# Altium footprint library Test.PcbLib: 245 footprints (part 15 of 17)
Each footprint in its own frame and in the unit in brackets; x right, y up, seen from the top. Pads: shape width x height; smd on the part's side, far side on the other; paste and mask are expansions set on the pad; w line width, h text height; cw(c..) or ccw(c..) is an arc to the next point about the centre after c.
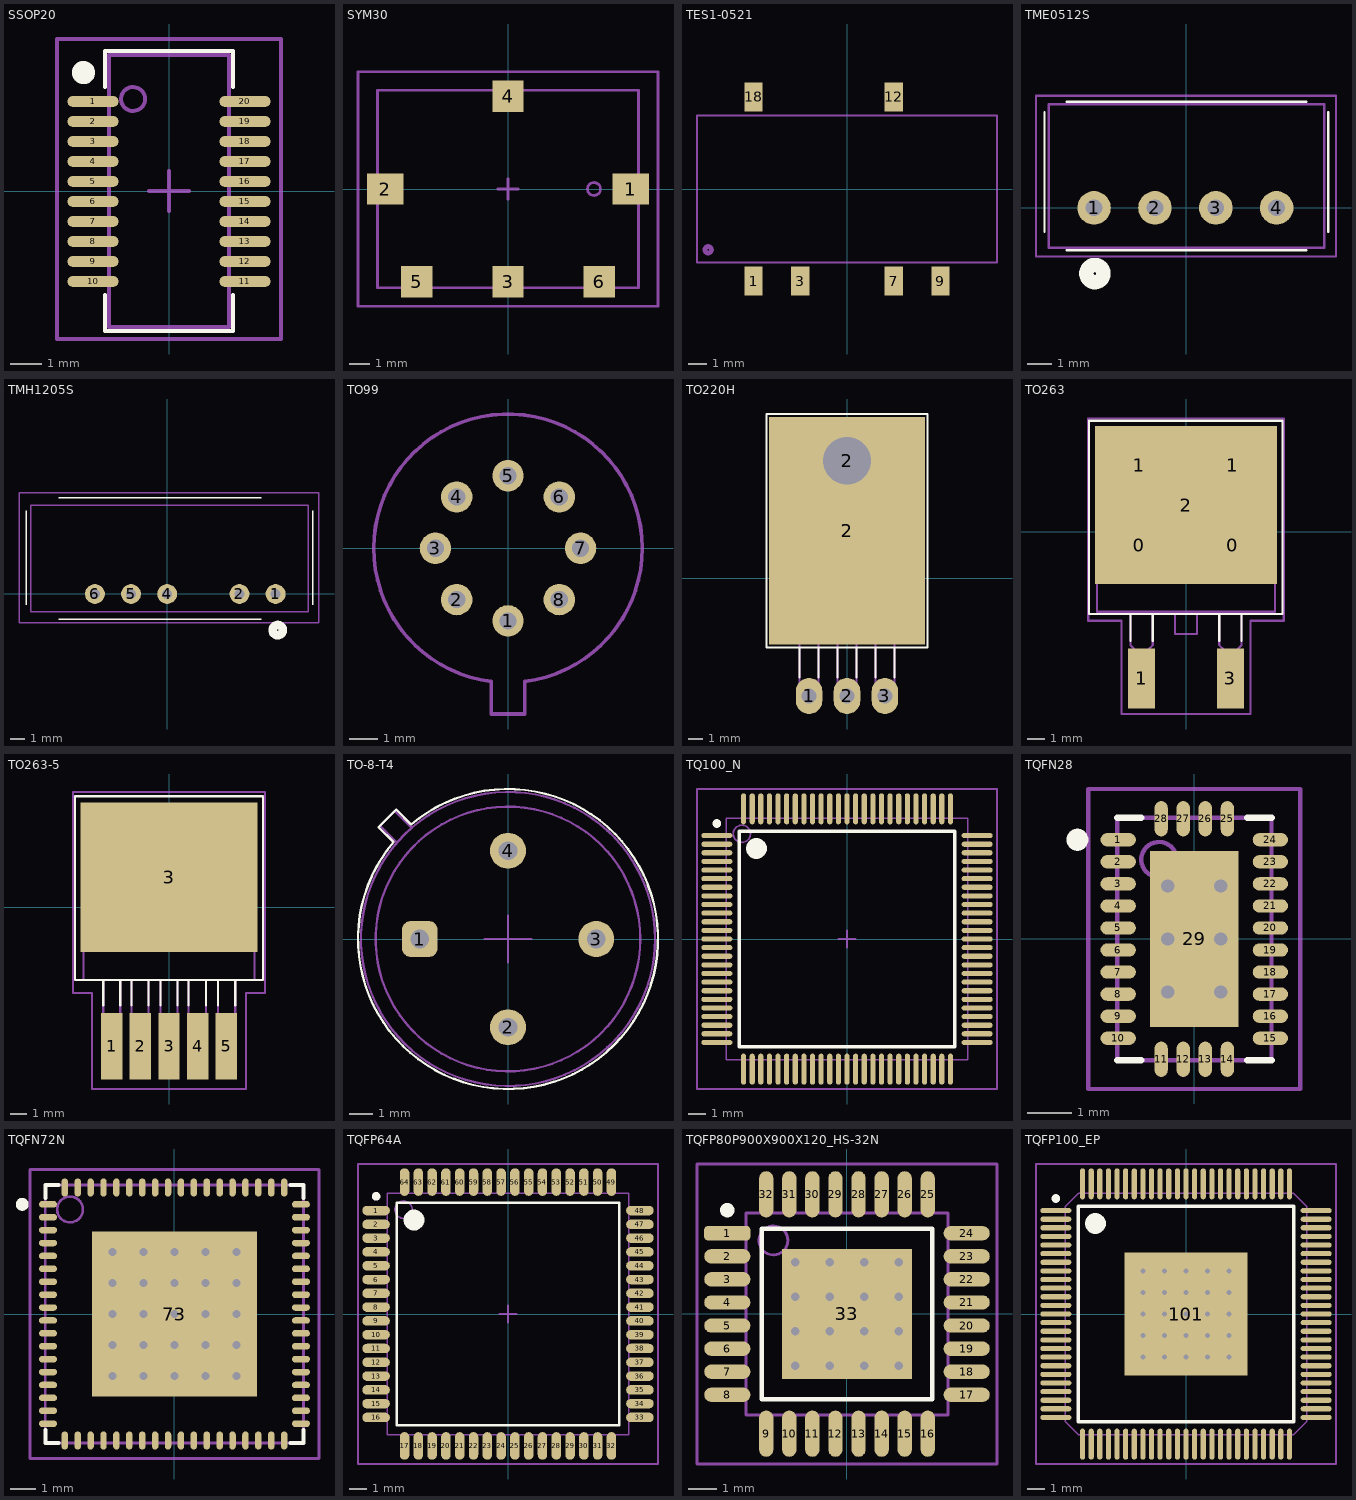
[diagram p14: the footprints below, top view; thin cyan lines are the x and y axes]

## SSOP20 [mil] "SSOP20 R0.635mm 8.6x3.8mm"
height 62.99
pads (20):
  oval 64x13.78 smd mask+2: 1(-95,112) 2(-95,87) 3(-95,62) 4(-95,37) 5(-95,12) 6(-95,-13) 7(-95,-38) 8(-95,-63) 9(-95,-88) 10(-95,-113) 11(95,-113) 12(95,-88) 13(95,-63) 14(95,-38) 15(95,-13) 16(95,12) 17(95,37) 18(95,62) 19(95,87) 20(95,112)
Top Overlay:
  circle w15: c-107,148 r7
  lines w5: -80,-130 -80,-175 80,-175 80,-130 ; -80,130 -80,175 80,175 80,130
Mechanical 13:
  circle w5: c-45,115 r15
  lines w5: -75,-170 -75,170 75,170 75,-170 -75,-170
Mechanical 15:
  lines w5: -25,0 25,0 ; 0,-25 0,25 ; -140,-185 -140,190 140,190 140,-185 -140,-185
3D body: height 62.99, standoff 5.91, extent -75,-170 75,170
3D body: height 63.39, standoff 62.99, extent -60.29,99.71 -29.71,130.29

## SYM30 [mil]
pads (6):
  rect 70x60 smd: 1(235,0) 2(-235,0)
  rect 60x60 smd: 3(0,-178) 4(0,178) 5(-175,-178) 6(175,-178)
Mechanical 13:
  circle w5: c164.72,0 r12.45
  lines w5: -250,-188.98 250,-188.98 250,188.98 -250,188.98 -250,-188.98
Mechanical 15:
  lines w5: -20,0 20,0 ; 0,-20 0,20 ; -287.4,-224.41 287.4,-224.41 287.4,224.41 -287.4,224.41 -287.4,-224.41
3D body: height 231, standoff 230, extent 151.75,-13.25 177.4,13.24
3D body: height 230, standoff 0, extent -250,-188.98 250,188.98

## TES1-0521 [mm] "TES10521 6 pin, Body 16.3x8x7mm (LxWxH), Pitch 2,54mm"
height 7
pads (6):
  rect 1x1.6 smd: 1(-5.08,-5) 3(-2.54,-5) 7(2.54,-5) 9(5.08,-5) 12(2.54,5) 18(-5.08,5)
Mechanical 13:
  circle w0.254: c-7.546,-3.302 r0.18
  lines w0.102: -8.15,-4 -8.15,4 8.15,4 8.15,-4 -8.15,-4
3D body: height 1.5, standoff 0, extent -5.334,-5.461 -4.826,-4
3D body: height 1.5, standoff 0, extent -2.794,-5.461 -2.286,-4
3D body: height 1.5, standoff 0, extent 2.286,-5.461 2.794,-4
3D body: height 1.5, standoff 0, extent 4.826,-5.461 5.334,-4
3D body: height 1.5, standoff 0, extent 2.286,4 2.794,5.461
3D body: height 1.5, standoff 0, extent -5.334,4 -4.826,5.461
3D body: height 7.01, standoff 7, extent -5.588,-3.302 -4.592,-2.304
3D body: height 7, standoff 0, extent -8.15,-4 8.15,4

## TME0512S [mm] "TME0512S 4 pin, Body 11.5x6x10.2mm (LxWxH), Pitch 2,54mm"
height 10.2
pads (4):
  round 1.4 hole 0.7: 1(-3.85,0) 2(-1.31,0) 3(1.23,0) 4(3.77,0)
Top Overlay:
  circle w0.6: c-3.814,-2.743 r0.359
  lines w0.102: -5.918,-1 -5.918,4 ; -5,-1.778 5,-1.778 ; -5,4.428 5,4.428 ; 5.918,-1 5.918,4
Mechanical 13:
  lines w0.102: -5.75,-1.675 5.75,-1.675 5.75,4.325 -5.75,4.325 -5.75,-1.675
Mechanical 15:
  lines w0.102: -6.274,-2.032 -6.274,4.674 6.248,4.674 6.248,-2.032 -6.274,-2.032
3D body: height 10.2, standoff 0.5, extent -5.105,-1.675 5.105,4.325
3D body: height 0.5, standoff 0, extent -5.75,-1.675 -5.105,4.325
3D body: height 0.5, standoff 0, extent 5.08,-1.675 5.75,4.325
3D body: height 0.5, standoff -3.2, extent 0.925,-0.203 1.509,0.203
3D body: height 0.5, standoff -3.2, extent 3.465,-0.203 4.049,0.203
3D body: height 0.5, standoff -3.2, extent -1.615,-0.203 -1.031,0.203
3D body: height 0.5, standoff -3.2, extent -4.155,-0.203 -3.571,0.203

## TMH1205S [mm] "TMH1205S 5 pin, Body 19.5x7.5x10.2mm (LxWxH), Pitch 2,54mm"
height 10.2
pads (5):
  round 1.4 hole 0.7: 1(7.62,0) 2(5.08,0) 4(0,0) 5(-2.54,0) 6(-5.08,0)
Top Overlay:
  circle w0.6: c7.769,-2.54 r0.359
  lines w0.102: -9.906,-0.762 -9.906,5.842 ; -7.62,-1.778 6.604,-1.778 ; -7.62,6.778 6.604,6.778 ; 10.246,-0.762 10.246,5.842
Mechanical 13:
  lines w0.102: -9.58,-1.25 9.92,-1.25 9.92,6.25 -9.58,6.25 -9.58,-1.25
Mechanical 15:
  lines w0.102: -10.414,-2.032 -10.414,7.112 10.668,7.112 10.668,-2.032 -10.414,-2.032
3D body: height 10.2, standoff 0.5, extent -9.58,-1.25 9.92,6.25
3D body: height 0.5, standoff 0, extent -9.58,-1.25 -8.89,6.25
3D body: height 0.5, standoff 0, extent 9.23,-1.25 9.92,6.25
3D body: height 0.5, standoff -3.2, extent -5.359,-0.203 -4.775,0.203
3D body: height 0.5, standoff -3.2, extent -2.819,-0.203 -2.235,0.203
3D body: height 0.5, standoff -3.2, extent -0.279,-0.203 0.305,0.203
3D body: height 0.5, standoff -3.2, extent 4.801,-0.203 5.385,0.203
3D body: height 0.5, standoff -3.2, extent 7.341,-0.203 7.925,0.203

## TO99 [mm] "TO-99"
height 4.7
pads (8):
  round 1.1 hole 0.6: 1(0,-2.54) 2(-1.796,-1.796) 3(-2.54,0) 4(-1.796,1.796) 5(0,2.54) 6(1.796,1.796) 7(2.54,0) 8(1.796,-1.796)
Mechanical 13:
  lines w0.127: -0.583,-5.8 0.583,-5.8 0.583,-4.664 ccw(c0,0) -0.583,-4.664 -0.583,-5.8
3D body: height 0, standoff -6, extent -2.096,1.504 -1.499,2.103
3D body: height 0, standoff -6, extent 1.504,1.499 2.102,2.097
3D body: height 0, standoff -6, extent 1.499,-2.103 2.096,-1.504
3D body: height 0, standoff -6, extent -2.103,-2.096 -1.505,-1.497
3D body: height 0, standoff -6, extent -0.305,-2.845 0.293,-2.246
3D body: height 0, standoff -6, extent -0.294,2.247 0.304,2.846
3D body: height 0, standoff -6, extent 2.247,-0.305 2.845,0.294
3D body: height 0, standoff -6, extent -2.845,-0.305 -2.247,0.294
3D body: height 1, standoff 0, extent -0.583,-5.8 0.583,-4.664
3D body: height 4.71, standoff 4.7, extent -0.305,-4.064 0.293,-3.465
3D body: height 4.7, standoff 0, extent -4.689,-4.699 4.674,4.682

## TO220H [mil] "TO-220 horizontal"
height 196.85
pads (5):
  oval 70x95 hole 39.37: 1(-100,-310) 2(0,-310) 3(100,-310)
  rect 410x600 smd paste-500: 2(0,125)
  round 157.48 hole 125.98 mask+47.24: 2(0,310)
Top Overlay:
  lines w5: -125,-260.83 -125,-182.09 ; -74.8,-260.83 -74.8,-182.09 ; -25,-260.83 -25,-182.09 ; 25.2,-260.83 25.2,-182.09 ; 75,-260.83 75,-182.09 ; 125.2,-260.83 125.2,-182.09 ; -212.6,-182.09 -212.6,433.07 212.6,433.07 212.6,-182.09 -212.6,-182.09
Mechanical 13:
  circle w5: c0,310 r75
  lines w5: -200,155 200,155 ; -125,-170 -125,-310 -75,-310 -75,-170 ; -25,-170 -25,-310 25,-310 25,-170 ; 75,-170 75,-310 125,-310 125,-170 ; -200,170 200,170 ; -200,170 -200,-170 200,-170 200,170 ; -200,170 -200,420 200,420 200,170
3D body: height 102.36, standoff 90.55, extent 75,-320 125,-170
3D body: height 90.55, standoff 0, extent 75,-320 125,-305
3D body: height 102.36, standoff 90.55, extent -25,-320 25,-170
3D body: height 90.55, standoff 0, extent -25,-320 25,-305
3D body: height 90.55, standoff 0, extent -125,-320 -75,-305
3D body: height 102.36, standoff 90.55, extent -125,-320 -75,-170
3D body: height 39.37, standoff 0, extent -200,170 200,420
3D body: height 196.85, standoff 0, extent -200,-170 200,170
3D body: height 0, standoff -125.98, extent -116.14,-317.91 -83.66,-302.17
3D body: height 0, standoff -125.98, extent -16.14,-317.91 16.34,-302.17
3D body: height 0, standoff -125.98, extent 83.86,-317.91 116.34,-302.17

## TO263 [mil] "TO263 3pin D2PAK"
height 137.8
pads (7):
  rrect8% 190x160 on Top Paste mask+275.59: 0(-105,-30) 0(105,-30) 1(-105,150) 1(105,150)
  rect 60x135 smd: 1(-100,-330) 3(100,-330)
  rect 410x355 smd paste-196.85: 2(0,60)
Top Overlay:
  lines w5: -125,-245 -125,-185 ; -75,-245 -75,-185 ; 75,-245 75,-185 ; 125,-245 125,-185 ; -218,-185 -218,250 217,250 217,-185 -218,-185
Mechanical 13:
  lines w5: -125,-180 -125,-255 -115,-265 -115,-370 -85,-370 -85,-265 -75,-255 -75,-180 ; -25,-180 -25,-230 25,-230 25,-180 ; 75,-180 75,-255 85,-265 85,-370 115,-370 115,-265 125,-255 125,-180 ; -200,-180 -200,215 -120,230 120,230 200,215 200,-180 -200,-180
  lines w6: -200,180 200,180
Mechanical 15:
  lines w5: -220,-200 -145,-200 -145,-410 145,-410 145,-200 220,-200 220,255 -220,255 -220,-200
3D body: height 105, standoff 80, extent -25,-230 25,-180
3D body: height 105, standoff 80, extent 75,-265 125,-180
3D body: height 105, standoff 0, extent 85,-280 115,-265
3D body: height 20, standoff 0, extent 85,-370 115,-280
3D body: height 20, standoff 0, extent -115,-370 -85,-280
3D body: height 105, standoff 0, extent -115,-280 -85,-265
3D body: height 105, standoff 80, extent -125,-265 -75,-180
3D body: height 175, standoff 0, extent -200,-180 200,180
3D body: height 50, standoff 0, extent -200,180 200,230

## TO263-5 [mil]
height 137.8
pads (6):
  rect 50x155 smd: 1(-134,-325) 2(-67,-325) 3(0,-325) 4(67,-325) 5(134,-325)
  rect 414.02x350 smd paste-393.7: 3(0,70)
Top Overlay:
  lines w5: -154,-230 -154,-170 ; -114,-230 -114,-170 ; -88,-230 -88,-170 ; -48,-230 -48,-170 ; -20,-230 -20,-170 ; 20,-230 20,-170 ; 46,-230 46,-170 ; 87,-230 87,-170 ; 115,-230 115,-170 ; 155,-230 155,-170 ; -220,-170 220,-170 220,260 -220,260 -220,-170
Top Paste:
  circle w35.43: c165.35,-59.06 r17.72
  circle w35.43: c82.68,-59.06 r17.72
  circle w35.43: c-165.35,-59.06 r17.72
  circle w35.43: c-82.68,-59.06 r17.72
  circle w35.43: c0,-59.06 r17.72
  circle w35.43: c0,27.56 r17.72
  circle w35.43: c-82.68,27.56 r17.72
  circle w35.43: c-165.35,27.56 r17.72
  circle w35.43: c82.68,27.56 r17.72
  circle w35.43: c165.35,27.56 r17.72
  circle w35.43: c0,114.17 r17.72
  circle w35.43: c-82.68,114.17 r17.72
  circle w35.43: c-165.35,114.17 r17.72
  circle w35.43: c82.68,114.17 r17.72
  circle w35.43: c165.35,114.17 r17.72
  circle w35.43: c0,200.79 r17.72
  circle w35.43: c-82.68,200.79 r17.72
  circle w35.43: c-165.35,200.79 r17.72
  circle w35.43: c82.68,200.79 r17.72
  circle w35.43: c165.35,200.79 r17.72
Mechanical 13:
  lines w5: -154,-170 -154,-340 -114,-340 -114,-170 ; -88,-170 -88,-340 -48,-340 -48,-170 200,-170 ; -20,-170 -20,-340 20,-340 20,-170 ; 46,-170 46,-340 86,-340 ; 87,-340 87,-170 ; 115,-170 115,-340 155,-340 155,-170 ; -200,170 200,170 ; -200,170 -200,-170 200,-170 ; -200,170 -200,220 200,220 200,170 ; 200,-170 200,170
Mechanical 15:
  lines w4: -40,0 40,0 ; 0,-40 0,40
  lines w5: -225,-200 -180,-200 -180,-425 180,-425 180,-200 225,-200 225,270 -225,270 -225,-200
3D body: height 137.8, standoff 0, extent -200,-170 200,170
3D body: height 39.37, standoff 0, extent -200,170 200,220

## TO-8-T4 [mm] "TO-8 4pin metal"
height 7
pads (4):
  rrect50% 1.55x1.55 hole 0.8: 1(-3.81,0)
  round 1.55 hole 0.8: 2(0,-3.81) 3(3.81,0) 4(0,3.81)
Top Overlay:
  lines w0.1: -4.944,4.184 ccw(c0,0) -4.184,4.944
  lines w0.102: -4.944,4.184 -5.587,4.826 -5.588,4.826 -4.826,5.588 -4.184,4.946 -4.184,4.944
Mechanical 13:
  circle w0.1: c0,0 r6.35
  circle w0.1: c0,0 r5.715
  lines w0.102: -4.826,4.191 -5.524,4.889 -4.889,5.524 -4.191,4.826
Mechanical 15:
  lines w0.102: -1.016,0 1.016,0 ; 0,-1.016 0,1.016
3D body: height 7, standoff 0, extent -5.715,-5.715 5.715,5.715
3D body: height 1, standoff 0, extent -6.35,-6.35 6.35,6.35
3D body: height 1, standoff 0, extent -5.524,4.191 -4.191,5.524

## TQ100_N [mm] "Thin QFP 100, 14x14mm, R0.5mm, IPC Medium Density"
height 1.6
pads (100):
  oval 1.8x0.3 smd mask+0.051: 1(-7.55,6) 2(-7.55,5.5) 3(-7.55,5) 4(-7.55,4.5) 5(-7.55,4) 6(-7.55,3.5) 7(-7.55,3) 8(-7.55,2.5) 9(-7.55,2) 10(-7.55,1.5) 11(-7.55,1) 12(-7.55,0.5) 13(-7.55,0) 14(-7.55,-0.5) 15(-7.55,-1) 16(-7.55,-1.5) 17(-7.55,-2) 18(-7.55,-2.5) 19(-7.55,-3) 20(-7.55,-3.5) 21(-7.55,-4) 22(-7.55,-4.5) 23(-7.55,-5) 24(-7.55,-5.5) 25(-7.55,-6) 51(7.55,-6) 52(7.55,-5.5) 53(7.55,-5) 54(7.55,-4.5) 55(7.55,-4) 56(7.55,-3.5) 57(7.55,-3) 58(7.55,-2.5) 59(7.55,-2) 60(7.55,-1.5) 61(7.55,-1) 62(7.55,-0.5) 63(7.55,0) 64(7.55,0.5) 65(7.55,1) 66(7.55,1.5) 67(7.55,2) 68(7.55,2.5) 69(7.55,3) 70(7.55,3.5) 71(7.55,4) 72(7.55,4.5) 73(7.55,5) 74(7.55,5.5) 75(7.55,6)
  oval 0.3x1.8 smd mask+0.051: 26(-6,-7.55) 27(-5.5,-7.55) 28(-5,-7.55) 29(-4.5,-7.55) 30(-4,-7.55) 31(-3.5,-7.55) 32(-3,-7.55) 33(-2.5,-7.55) 34(-2,-7.55) 35(-1.5,-7.55) 36(-1,-7.55) 37(-0.5,-7.55) 38(0,-7.55) 39(0.5,-7.55) 40(1,-7.55) 41(1.5,-7.55) 42(2,-7.55) 43(2.5,-7.55) 44(3,-7.55) 45(3.5,-7.55) 46(4,-7.55) 47(4.5,-7.55) 48(5,-7.55) 49(5.5,-7.55) 50(6,-7.55) 76(6,7.55) 77(5.5,7.55) 78(5,7.55) 79(4.5,7.55) 80(4,7.55) 81(3.5,7.55) 82(3,7.55) 83(2.5,7.55) 84(2,7.55) 85(1.5,7.55) 86(1,7.55) 87(0.5,7.55) 88(0,7.55) 89(-0.5,7.55) 90(-1,7.55) 91(-1.5,7.55) 92(-2,7.55) 93(-2.5,7.55) 94(-3,7.55) 95(-3.5,7.55) 96(-4,7.55) 97(-4.5,7.55) 98(-5,7.55) 99(-5.5,7.55) 100(-6,7.55)
Top Overlay:
  circle w0.6: c-5.25,5.25 r0.3
  circle w0.25: c-7.55,6.7 r0.125
  lines w0.2: -6.25,-6.25 6.25,-6.25 6.25,6.25 -6.25,6.25 -6.25,-6.25
Mechanical 13:
  circle w0.1: c-6.1,6.1 r0.5
  lines w0.1: -7,-7 7,-7 7,7 -7,7 -7,-7
Mechanical 15:
  lines w0.1: -0.5,0 0.5,0 ; 0,-0.5 0,0.5 ; -8.7,-8.7 8.7,-8.7 8.7,8.7 -8.7,8.7 -8.7,-8.7
3D body: height 1.6, standoff 0, extent -7,-7 7,7

## TQFN28 [mm] "TQFN 28pin 0.8mm R0.5mm"
height 0.8
pads (29):
  oval 0.8x0.3 smd mask+0.025: 1(-1.725,2.25) 2(-1.725,1.75) 3(-1.725,1.25) 4(-1.725,0.75) 5(-1.725,0.25) 6(-1.725,-0.25) 7(-1.725,-0.75) 8(-1.725,-1.25) 9(-1.725,-1.75) 10(-1.725,-2.25) 15(1.725,-2.25) 16(1.725,-1.75) 17(1.725,-1.25) 18(1.725,-0.75) 19(1.725,-0.25) 20(1.725,0.25) 21(1.725,0.75) 22(1.725,1.25) 23(1.725,1.75) 24(1.725,2.25)
  oval 0.3x0.8 smd mask+0.025: 11(-0.75,-2.725) 12(-0.25,-2.725) 13(0.25,-2.725) 14(0.75,-2.725) 25(0.75,2.725) 26(0.25,2.725) 27(-0.25,2.725) 28(-0.75,2.725)
  rect 2x4 smd paste-5 mask-3: 29(0,0)
via 0.6,-1.2 diameter 0.65 hole 0.3
via -0.6,-1.2 diameter 0.65 hole 0.3
via 0.6,0 diameter 0.65 hole 0.3
via -0.6,0 diameter 0.65 hole 0.3
via 0.6,1.2 diameter 0.65 hole 0.3
via -0.6,1.2 diameter 0.65 hole 0.3
Top Overlay:
  circle w0.25: c-2.65,2.25 r0.125
  lines w0.15: -1.75,-2.75 -1.2,-2.75 ; -1.75,2.75 -1.2,2.75 ; 1.2,-2.75 1.75,-2.75 ; 1.2,2.75 1.75,2.75
Top Paste:
  region: -0.9,-0.85 -0.475,-0.85 -0.25,-1.075 0.25,-1.075 0.475,-0.85 0.9,-0.85 0.9,-0.35 0.475,-0.35 0.275,-0.15 -0.275,-0.15 -0.475,-0.35 -0.9,-0.35
  region: -0.9,-1.9 -0.9,-1.55 -0.475,-1.55 -0.25,-1.325 0.25,-1.325 0.475,-1.55 0.9,-1.55 0.9,-1.9
  region: -0.9,1.9 -0.9,1.55 -0.475,1.55 -0.25,1.325 0.25,1.325 0.475,1.55 0.9,1.55 0.9,1.9
  region: -0.9,0.85 -0.475,0.85 -0.25,1.075 0.25,1.075 0.475,0.85 0.9,0.85 0.9,0.35 0.475,0.35 0.275,0.15 -0.275,0.15 -0.475,0.35 -0.9,0.35
Top Solder:
  region: -1,2 -1,1.2 -0.931,1.2 -0.906,1.327 -0.834,1.434 -0.727,1.506 -0.6,1.531 -0.473,1.506 -0.366,1.434 -0.294,1.327 -0.269,1.2 -0.275,1.2 -0.269,1.2 -0.294,1.073 -0.366,0.966 -0.473,0.894 -0.6,0.869 -0.727,0.894 -0.834,0.966 -0.906,1.073 -0.931,1.2 -0.925,1.2 -1,1.2 -1,0 -0.931,0 -0.906,0.127 -0.834,0.234 -0.727,0.306 -0.6,0.331 -0.473,0.306 -0.366,0.234 -0.294,0.127 -0.269,0 -0.275,0 -0.269,0 -0.294,-0.127 -0.366,-0.234 -0.473,-0.306 -0.6,-0.331 -0.727,-0.306 -0.834,-0.234 -0.906,-0.127 -0.931,0 -0.925,0 -1,0 -1,-1.2 -0.931,-1.2 -0.906,-1.073 -0.834,-0.966 -0.727,-0.894 -0.6,-0.869 -0.473,-0.894 -0.366,-0.966 -0.294,-1.073 -0.269,-1.2 -0.275,-1.2 -0.269,-1.2 -0.294,-1.327 -0.366,-1.434 -0.473,-1.506 -0.6,-1.531 -0.727,-1.506 -0.834,-1.434 -0.906,-1.327 -0.931,-1.2 -0.925,-1.2 -1,-1.2 -1,-2 1,-2 1,-1.2 0.931,-1.2 0.906,-1.327 0.834,-1.434 0.727,-1.506 0.6,-1.531 0.473,-1.506 0.366,-1.434 0.294,-1.327 0.269,-1.2 0.275,-1.2 0.269,-1.2 0.294,-1.073 0.366,-0.966 0.473,-0.894 0.6,-0.869 0.727,-0.894 0.834,-0.966 0.906,-1.073 0.931,-1.2 0.925,-1.2 1,-1.2 1,0 0.931,0 0.906,-0.127 0.834,-0.234 0.727,-0.306 0.6,-0.331 0.473,-0.306 0.366,-0.234 0.294,-0.127 0.269,0 0.275,0 0.269,0 0.294,0.127 0.366,0.234 0.473,0.306 0.6,0.331 0.727,0.306 0.834,0.234 0.906,0.127 0.931,0 0.925,0 1,0 1,1.2 0.931,1.2 0.906,1.073 0.834,0.966 0.727,0.894 0.6,0.869 0.473,0.894 0.366,0.966 0.294,1.073 0.269,1.2 0.275,1.2 0.269,1.2 0.294,1.327 0.366,1.434 0.473,1.506 0.6,1.531 0.727,1.506 0.834,1.434 0.906,1.327 0.931,1.2 0.925,1.2 1,1.2 1,2
Mechanical 12:
  circle w0.4: c-0.6,1.2 r0.15
  circle w0.4: c0.6,1.2 r0.15
  circle w0.4: c-0.6,0 r0.15
  circle w0.4: c0.6,0 r0.15
  circle w0.4: c-0.6,-1.2 r0.15
  circle w0.4: c0.6,-1.2 r0.15
Mechanical 13:
  circle w0.1: c-0.8,1.8 r0.4
  lines w0.1: -1.75,-2.75 1.75,-2.75 1.75,2.75 -1.75,2.75 -1.75,-2.75
Mechanical 15:
  lines w0.1: -0.5,0 0.5,0 ; 0,-0.5 0,0.5 ; -2.4,-3.4 2.4,-3.4 2.4,3.4 -2.4,3.4 -2.4,-3.4
3D body: height 0.8, standoff 0.01, extent -1.75,-2.75 1.75,2.75
3D body: height 0.81, standoff 0.8, extent -1.208,1.392 -0.392,2.208

## TQFN72N [mm]
height 0.8
pads (73):
  oval 0.7x0.25 smd mask+0.025: 1(-4.9,4.25) 2(-4.9,3.75) 3(-4.9,3.25) 4(-4.9,2.75) 5(-4.9,2.25) 6(-4.9,1.75) 7(-4.9,1.25) 8(-4.9,0.75) 9(-4.9,0.25) 10(-4.9,-0.25) 11(-4.9,-0.75) 12(-4.9,-1.25) 13(-4.9,-1.75) 14(-4.9,-2.25) 15(-4.9,-2.75) 16(-4.9,-3.25) 17(-4.9,-3.75) 18(-4.9,-4.25) 37(4.9,-4.25) 38(4.9,-3.75) 39(4.9,-3.25) 40(4.9,-2.75) 41(4.9,-2.25) 42(4.9,-1.75) 43(4.9,-1.25) 44(4.9,-0.75) 45(4.9,-0.25) 46(4.9,0.25) 47(4.9,0.75) 48(4.9,1.25) 49(4.9,1.75) 50(4.9,2.25) 51(4.9,2.75) 52(4.9,3.25) 53(4.9,3.75) 54(4.9,4.25)
  oval 0.25x0.7 smd mask+0.025: 19(-4.25,-4.9) 20(-3.75,-4.9) 21(-3.25,-4.9) 22(-2.75,-4.9) 23(-2.25,-4.9) 24(-1.75,-4.9) 25(-1.25,-4.9) 26(-0.75,-4.9) 27(-0.25,-4.9) 28(0.25,-4.9) 29(0.75,-4.9) 30(1.25,-4.9) 31(1.75,-4.9) 32(2.25,-4.9) 33(2.75,-4.9) 34(3.25,-4.9) 35(3.75,-4.9) 36(4.25,-4.9) 55(4.25,4.9) 56(3.75,4.9) 57(3.25,4.9) 58(2.75,4.9) 59(2.25,4.9) 60(1.75,4.9) 61(1.25,4.9) 62(0.75,4.9) 63(0.25,4.9) 64(-0.25,4.9) 65(-0.75,4.9) 66(-1.25,4.9) 67(-1.75,4.9) 68(-2.25,4.9) 69(-2.75,4.9) 70(-3.25,4.9) 71(-3.75,4.9) 72(-4.25,4.9)
  rect 6.4x6.4 smd paste-7.62 mask-8: 73(0,0)
via 2.4,-2.4 diameter 0.65 hole 0.3
via 1.2,-2.4 diameter 0.65 hole 0.3
via 0,-2.4 diameter 0.65 hole 0.3
via -1.2,-2.4 diameter 0.65 hole 0.3
via -2.4,-2.4 diameter 0.65 hole 0.3
via 2.4,-1.2 diameter 0.65 hole 0.3
via 1.2,-1.2 diameter 0.65 hole 0.3
via 0,-1.2 diameter 0.65 hole 0.3
via -1.2,-1.2 diameter 0.65 hole 0.3
via -2.4,-1.2 diameter 0.65 hole 0.3
via 2.4,0 diameter 0.65 hole 0.3
via 1.2,0 diameter 0.65 hole 0.3
via 0,0 diameter 0.65 hole 0.3
via -1.2,0 diameter 0.65 hole 0.3
via -2.4,0 diameter 0.65 hole 0.3
via 2.4,1.2 diameter 0.65 hole 0.3
via 1.2,1.2 diameter 0.65 hole 0.3
via 0,1.2 diameter 0.65 hole 0.3
via -1.2,1.2 diameter 0.65 hole 0.3
via -2.4,1.2 diameter 0.65 hole 0.3
via 2.4,2.4 diameter 0.65 hole 0.3
via 1.2,2.4 diameter 0.65 hole 0.3
via 0,2.4 diameter 0.65 hole 0.3
via -1.2,2.4 diameter 0.65 hole 0.3
via -2.4,2.4 diameter 0.65 hole 0.3
Top Overlay:
  circle w0.25: c-5.9,4.25 r0.125
  lines w0.15: -5,-4.5 -5,-5 -4.5,-5 ; -5,4.5 -5,5 -4.5,5 ; 4.5,-5 5,-5 5,-4.5 ; 4.5,5 5,5 5,4.5
Top Paste:
  drawing of 36 lines, arcs and shapes, not listed
Top Solder:
  drawing of 2 lines, arcs and shapes, not listed
Mechanical 12:
  circle w0.4: c-2.4,2.4 r0.15
  circle w0.4: c-1.2,2.4 r0.15
  circle w0.4: c0,2.4 r0.15
  circle w0.4: c1.2,2.4 r0.15
  circle w0.4: c2.4,2.4 r0.15
  circle w0.4: c-2.4,1.2 r0.15
  circle w0.4: c-1.2,1.2 r0.15
  circle w0.4: c0,1.2 r0.15
  circle w0.4: c1.2,1.2 r0.15
  circle w0.4: c2.4,1.2 r0.15
  circle w0.4: c-2.4,0 r0.15
  circle w0.4: c-1.2,0 r0.15
  circle w0.4: c0,0 r0.15
  circle w0.4: c1.2,0 r0.15
  circle w0.4: c2.4,0 r0.15
  circle w0.4: c-2.4,-1.2 r0.15
  circle w0.4: c-1.2,-1.2 r0.15
  circle w0.4: c0,-1.2 r0.15
  circle w0.4: c1.2,-1.2 r0.15
  circle w0.4: c2.4,-1.2 r0.15
  circle w0.4: c-2.4,-2.4 r0.15
  circle w0.4: c-1.2,-2.4 r0.15
  circle w0.4: c0,-2.4 r0.15
  circle w0.4: c1.2,-2.4 r0.15
  circle w0.4: c2.4,-2.4 r0.15
Mechanical 13:
  circle w0.1: c-4.05,4.05 r0.5
  lines w0.1: -5,-5 5,-5 5,5 -5,5 -5,-5
Mechanical 15:
  lines w0.1: -0.5,0 0.5,0 ; 0,-0.5 0,0.5 ; -5.6,-5.6 5.6,-5.6 5.6,5.6 -5.6,5.6 -5.6,-5.6
3D body: height 0.81, standoff 0.8, extent -4.56,3.54 -3.54,4.56
3D body: height 0.8, standoff 0.01, extent -5,-5 5,5

## TQFP64A [mm] "TQFP, 64-Leads, Body 16,0x16,0mm (max), Pitch 0,80mm, IPC Medium Density"
height 1
pads (64):
  oval 1.6x0.55 smd mask+0.051: 1(-7.65,6) 2(-7.65,5.2) 3(-7.65,4.4) 4(-7.65,3.6) 5(-7.65,2.8) 6(-7.65,2) 7(-7.65,1.2) 8(-7.65,0.4) 9(-7.65,-0.4) 10(-7.65,-1.2) 11(-7.65,-2) 12(-7.65,-2.8) 13(-7.65,-3.6) 14(-7.65,-4.4) 15(-7.65,-5.2) 16(-7.65,-6) 33(7.65,-6) 34(7.65,-5.2) 35(7.65,-4.4) 36(7.65,-3.6) 37(7.65,-2.8) 38(7.65,-2) 39(7.65,-1.2) 40(7.65,-0.4) 41(7.65,0.4) 42(7.65,1.2) 43(7.65,2) 44(7.65,2.8) 45(7.65,3.6) 46(7.65,4.4) 47(7.65,5.2) 48(7.65,6)
  oval 0.55x1.6 smd mask+0.051: 17(-6,-7.65) 18(-5.2,-7.65) 19(-4.4,-7.65) 20(-3.6,-7.65) 21(-2.8,-7.65) 22(-2,-7.65) 23(-1.2,-7.65) 24(-0.4,-7.65) 25(0.4,-7.65) 26(1.2,-7.65) 27(2,-7.65) 28(2.8,-7.65) 29(3.6,-7.65) 30(4.4,-7.65) 31(5.2,-7.65) 32(6,-7.65) 49(6,7.65) 50(5.2,7.65) 51(4.4,7.65) 52(3.6,7.65) 53(2.8,7.65) 54(2,7.65) 55(1.2,7.65) 56(0.4,7.65) 57(-0.4,7.65) 58(-1.2,7.65) 59(-2,7.65) 60(-2.8,7.65) 61(-3.6,7.65) 62(-4.4,7.65) 63(-5.2,7.65) 64(-6,7.65)
Top Overlay:
  circle w0.25: c-7.65,6.825 r0.125
  circle w0.6: c-5.45,5.45 r0.3
  lines w0.127: -6.45,-6.45 -6.45,6.45 6.45,6.45 6.45,-6.45 -6.45,-6.45
Mechanical 13:
  circle w0.1: c-6.05,6.05 r0.5
  lines w0.1: -7,-7 -7,7 7,7 7,-7 -7,-7
Mechanical 15:
  lines w0.1: -0.5,0 0.5,0 ; 0,-0.5 0,0.5 ; -8.7,-8.7 -8.7,8.7 8.7,8.7 8.7,-8.7 -8.7,-8.7
3D body: height 1, standoff 0.1, extent -7,-7 7,7
3D body: height 1.05, standoff 0.9, extent -6.56,5.54 -5.54,6.56

## TQFP80P900X900X120_HS-32N [mm] "TQFP, 32-Leads, Body 9,0x9,0mm (max), Pitch 0,80mm, IPC Medium Density"
height 1.2
pads (33):
  rrect50% 1.6x0.5 smd mask+0.051: 1(-4.15,2.8)
  oval 1.6x0.5 smd mask+0.051: 2(-4.15,2) 3(-4.15,1.2) 4(-4.15,0.4) 5(-4.15,-0.4) 6(-4.15,-1.2) 7(-4.15,-2) 8(-4.15,-2.8) 17(4.15,-2.8) 18(4.15,-2) 19(4.15,-1.2) 20(4.15,-0.4) 21(4.15,0.4) 22(4.15,1.2) 23(4.15,2) 24(4.15,2.8)
  oval 0.5x1.6 smd mask+0.051: 9(-2.8,-4.15) 10(-2,-4.15) 11(-1.2,-4.15) 12(-0.4,-4.15) 13(0.4,-4.15) 14(1.2,-4.15) 15(2,-4.15) 16(2.8,-4.15) 25(2.8,4.15) 26(2,4.15) 27(1.2,4.15) 28(0.4,4.15) 29(-0.4,4.15) 30(-1.2,4.15) 31(-2,4.15) 32(-2.8,4.15)
  rect 4.5x4.5 smd paste-4 mask-5: 33(0,0)
via 1.8,-1.8 diameter 0.65 hole 0.3
via 0.6,-1.8 diameter 0.65 hole 0.3
via -0.6,-1.8 diameter 0.65 hole 0.3
via -1.8,-1.8 diameter 0.65 hole 0.3
via 1.8,-0.6 diameter 0.65 hole 0.3
via 0.6,-0.6 diameter 0.65 hole 0.3
via -0.6,-0.6 diameter 0.65 hole 0.3
via -1.8,-0.6 diameter 0.65 hole 0.3
via 1.8,0.6 diameter 0.65 hole 0.3
via 0.6,0.6 diameter 0.65 hole 0.3
via -0.6,0.6 diameter 0.65 hole 0.3
via -1.8,0.6 diameter 0.65 hole 0.3
via 1.8,1.8 diameter 0.65 hole 0.3
via 0.6,1.8 diameter 0.65 hole 0.3
via -0.6,1.8 diameter 0.65 hole 0.3
via -1.8,1.8 diameter 0.65 hole 0.3
Top Overlay:
  circle w0.25: c-4.15,3.6 r0.125
  lines w0.15: -2.95,-2.95 2.95,-2.95 2.95,2.95 -2.95,2.95 -2.95,-2.95
Top Paste:
  region: -0.45,0.3 -0.45,-0.3 -0.3,-0.45 0.3,-0.45 0.45,-0.3 0.45,0.3 0.3,0.45 -0.3,0.45
  region: 0.3,-2.15 -0.3,-2.15 -0.3,-0.75 0.3,-0.75
  region: 1.5,-2.15 1.494,-1.8 1.517,-1.683 1.584,-1.584 1.683,-1.517 1.8,-1.494 1.8,-1.5 2.15,-1.5 2.15,-0.9 1.8,-0.906 1.683,-0.883 1.584,-0.816 1.517,-0.717 1.494,-0.6 1.5,-0.6 0.906,-0.6 0.883,-0.717 0.816,-0.816 0.717,-0.883 0.6,-0.906 0.6,-0.9 0.6,-1.5 0.6,-1.494 0.717,-1.517 0.816,-1.584 0.883,-1.683 0.906,-1.8 0.9,-1.8 0.9,-2.15
  region: -2.15,-0.3 -2.15,0.3 -0.75,0.3 -0.75,-0.3
  region: -2.15,-1.5 -1.8,-1.494 -1.683,-1.517 -1.584,-1.584 -1.517,-1.683 -1.494,-1.8 -1.5,-1.8 -1.5,-2.15 -0.9,-2.15 -0.906,-1.8 -0.883,-1.683 -0.816,-1.584 -0.717,-1.517 -0.6,-1.494 -0.6,-1.5 -0.6,-0.906 -0.717,-0.883 -0.816,-0.816 -0.883,-0.717 -0.906,-0.6 -0.9,-0.6 -1.5,-0.6 -1.494,-0.6 -1.517,-0.717 -1.584,-0.816 -1.683,-0.883 -1.8,-0.906 -1.8,-0.9 -2.15,-0.9
  region: 2.15,0.3 2.15,-0.3 0.75,-0.3 0.75,0.3
  region: 2.15,1.5 1.8,1.494 1.683,1.517 1.584,1.584 1.517,1.683 1.494,1.8 1.5,1.8 1.5,2.15 0.9,2.15 0.906,1.8 0.883,1.683 0.816,1.584 0.717,1.517 0.6,1.494 0.6,1.5 0.6,0.906 0.717,0.883 0.816,0.816 0.883,0.717 0.906,0.6 0.9,0.6 1.5,0.6 1.494,0.6 1.517,0.717 1.584,0.816 1.683,0.883 1.8,0.906 1.8,0.9 2.15,0.9
  region: -1.5,2.15 -1.494,1.8 -1.517,1.683 -1.584,1.584 -1.683,1.517 -1.8,1.494 -1.8,1.5 -2.15,1.5 -2.15,0.9 -1.8,0.906 -1.683,0.883 -1.584,0.816 -1.517,0.717 -1.494,0.6 -1.5,0.6 -0.906,0.6 -0.883,0.717 -0.816,0.816 -0.717,0.883 -0.6,0.906 -0.6,0.9 -0.6,1.5 -0.6,1.494 -0.717,1.517 -0.816,1.584 -0.883,1.683 -0.906,1.8 -0.9,1.8 -0.9,2.15
  region: -0.3,2.15 0.3,2.15 0.3,0.75 -0.3,0.75
Top Solder:
  drawing of 1 lines, arcs and shapes, not listed
Mechanical 12:
  circle w0.4: c1.8,-1.8 r0.15
  circle w0.4: c0.6,-1.8 r0.15
  circle w0.4: c-0.6,-1.8 r0.15
  circle w0.4: c-1.8,-1.8 r0.15
  circle w0.4: c1.8,-0.6 r0.15
  circle w0.4: c0.6,-0.6 r0.15
  circle w0.4: c-0.6,-0.6 r0.15
  circle w0.4: c-1.8,-0.6 r0.15
  circle w0.4: c1.8,0.6 r0.15
  circle w0.4: c0.6,0.6 r0.15
  circle w0.4: c-0.6,0.6 r0.15
  circle w0.4: c-1.8,0.6 r0.15
  circle w0.4: c1.8,1.8 r0.15
  circle w0.4: c0.6,1.8 r0.15
  circle w0.4: c-0.6,1.8 r0.15
  circle w0.4: c-1.8,1.8 r0.15
Mechanical 13:
  circle w0.1: c-2.55,2.55 r0.5
  lines w0.1: -3.5,-3.5 3.5,-3.5 3.5,3.5 -3.5,3.5 -3.5,-3.5
Mechanical 15:
  lines w0.1: -0.5,0 0.5,0 ; 0,-0.5 0,0.5 ; -5.2,-5.2 5.2,-5.2 5.2,5.2 -5.2,5.2 -5.2,-5.2
3D body: height 1.21, standoff 1.2, extent -3.058,2.048 -2.04,3.058
3D body: height 1.2, standoff 0.1, extent -3.5,-3.5 3.5,3.5

## TQFP100_EP [mm] "Thin QFP 100, 14x14mm, R0.5mm, IPC Medium Density"
height 1.2
pads (101):
  oval 1.8x0.3 smd mask+0.038: 1(-7.55,6) 2(-7.55,5.5) 3(-7.55,5) 4(-7.55,4.5) 5(-7.55,4) 6(-7.55,3.5) 7(-7.55,3) 8(-7.55,2.5) 9(-7.55,2) 10(-7.55,1.5) 11(-7.55,1) 12(-7.55,0.5) 13(-7.55,0) 14(-7.55,-0.5) 15(-7.55,-1) 16(-7.55,-1.5) 17(-7.55,-2) 18(-7.55,-2.5) 19(-7.55,-3) 20(-7.55,-3.5) 21(-7.55,-4) 22(-7.55,-4.5) 23(-7.55,-5) 24(-7.55,-5.5) 25(-7.55,-6) 51(7.55,-6) 52(7.55,-5.5) 53(7.55,-5) 54(7.55,-4.5) 55(7.55,-4) 56(7.55,-3.5) 57(7.55,-3) 58(7.55,-2.5) 59(7.55,-2) 60(7.55,-1.5) 61(7.55,-1) 62(7.55,-0.5) 63(7.55,0) 64(7.55,0.5) 65(7.55,1) 66(7.55,1.5) 67(7.55,2) 68(7.55,2.5) 69(7.55,3) 70(7.55,3.5) 71(7.55,4) 72(7.55,4.5) 73(7.55,5) 74(7.55,5.5) 75(7.55,6)
  oval 0.3x1.8 smd mask+0.038: 26(-6,-7.55) 27(-5.5,-7.55) 28(-5,-7.55) 29(-4.5,-7.55) 30(-4,-7.55) 31(-3.5,-7.55) 32(-3,-7.55) 33(-2.5,-7.55) 34(-2,-7.55) 35(-1.5,-7.55) 36(-1,-7.55) 37(-0.5,-7.55) 38(0,-7.55) 39(0.5,-7.55) 40(1,-7.55) 41(1.5,-7.55) 42(2,-7.55) 43(2.5,-7.55) 44(3,-7.55) 45(3.5,-7.55) 46(4,-7.55) 47(4.5,-7.55) 48(5,-7.55) 49(5.5,-7.55) 50(6,-7.55) 76(6,7.55) 77(5.5,7.55) 78(5,7.55) 79(4.5,7.55) 80(4,7.55) 81(3.5,7.55) 82(3,7.55) 83(2.5,7.55) 84(2,7.55) 85(1.5,7.55) 86(1,7.55) 87(0.5,7.55) 88(0,7.55) 89(-0.5,7.55) 90(-1,7.55) 91(-1.5,7.55) 92(-2,7.55) 93(-2.5,7.55) 94(-3,7.55) 95(-3.5,7.55) 96(-4,7.55) 97(-4.5,7.55) 98(-5,7.55) 99(-5.5,7.55) 100(-6,7.55)
  rect 7.15x7.15 smd paste-5 mask-5: 101(0,0)
via -2.5,-2.5 diameter 0.65 hole 0.3
via -2.5,-1.25 diameter 0.65 hole 0.3
via -1.25,-2.5 diameter 0.65 hole 0.3
via -1.25,-1.25 diameter 0.65 hole 0.3
via 1.25,-2.5 diameter 0.65 hole 0.3
via 1.25,-1.25 diameter 0.65 hole 0.3
via 2.5,-2.5 diameter 0.65 hole 0.3
via 2.5,-1.25 diameter 0.65 hole 0.3
via 2.5,2.5 diameter 0.65 hole 0.3
via 2.5,1.25 diameter 0.65 hole 0.3
via 1.25,2.5 diameter 0.65 hole 0.3
via 1.25,1.25 diameter 0.65 hole 0.3
via -1.25,2.5 diameter 0.65 hole 0.3
via -1.25,1.25 diameter 0.65 hole 0.3
via -2.5,2.5 diameter 0.65 hole 0.3
via -2.5,1.25 diameter 0.65 hole 0.3
via 0,0 diameter 0.65 hole 0.3
via -1.25,0 diameter 0.65 hole 0.3
via -2.5,0 diameter 0.65 hole 0.3
via 1.25,0 diameter 0.65 hole 0.3
via 2.5,0 diameter 0.65 hole 0.3
via 0,-2.5 diameter 0.65 hole 0.3
via 0,-1.25 diameter 0.65 hole 0.3
via 0,2.5 diameter 0.65 hole 0.3
via 0,1.25 diameter 0.65 hole 0.3
Top Overlay:
  circle w0.6: c-5.25,5.25 r0.3
  circle w0.25: c-7.55,6.7 r0.125
  lines w0.2: -6.25,-6.25 6.25,-6.25 6.25,6.25 -6.25,6.25 -6.25,-6.25
Top Paste:
  drawing of 36 lines, arcs and shapes, not listed
Top Solder:
  drawing of 1 lines, arcs and shapes, not listed
Mechanical 12:
  circle w0.4: c-2.5,-2.5 r0.15
  circle w0.4: c-2.5,-1.25 r0.15
  circle w0.4: c-1.25,-2.5 r0.15
  circle w0.4: c-1.25,-1.25 r0.15
  circle w0.4: c1.25,-2.5 r0.15
  circle w0.4: c1.25,-1.25 r0.15
  circle w0.4: c2.5,-2.5 r0.15
  circle w0.4: c2.5,-1.25 r0.15
  circle w0.4: c2.5,2.5 r0.15
  circle w0.4: c2.5,1.25 r0.15
  circle w0.4: c1.25,2.5 r0.15
  circle w0.4: c1.25,1.25 r0.15
  circle w0.4: c-1.25,2.5 r0.15
  circle w0.4: c-1.25,1.25 r0.15
  circle w0.4: c-2.5,2.5 r0.15
  circle w0.4: c-2.5,1.25 r0.15
  circle w0.4: c-1.25,0 r0.15
  circle w0.4: c-2.5,0 r0.15
  circle w0.4: c1.25,0 r0.15
  circle w0.4: c2.5,0 r0.15
  circle w0.4: c0,-2.5 r0.15
  circle w0.4: c0,-1.25 r0.15
  circle w0.4: c0,2.5 r0.15
  circle w0.4: c0,1.25 r0.15
  circle w0.4: c0,0 r0.15
Mechanical 13:
  circle w0.1: c-5.25,5.258 r0.5
  lines w0.1: -7,-6.233 -7,6.233 -6.233,7 6.233,7 7,6.233 7,-6.233 6.233,-7 -6.233,-7 -7,-6.233
Mechanical 15:
  lines w0.1: -0.5,0 0.5,0 ; 0,-0.5 0,0.5 ; -8.7,-8.7 8.7,-8.7 8.7,8.7 -8.7,8.7 -8.7,-8.7
3D body: height 1.05, standoff 0, extent -7,-7 7.01,7.01
3D body: height 1.05, standoff 0, extent -5.74,4.75 -4.728,5.764